# Altium footprint library Pcblib.PcbLib: 281 footprints (part 17 of 18)
Each footprint in its own frame and in the unit in brackets; x right, y up, seen from the top. Pads: shape width x height; smd on the part's side, far side on the other; paste and mask are expansions set on the pad; w line width, h text height; cw(c..) or ccw(c..) is an arc to the next point about the centre after c.
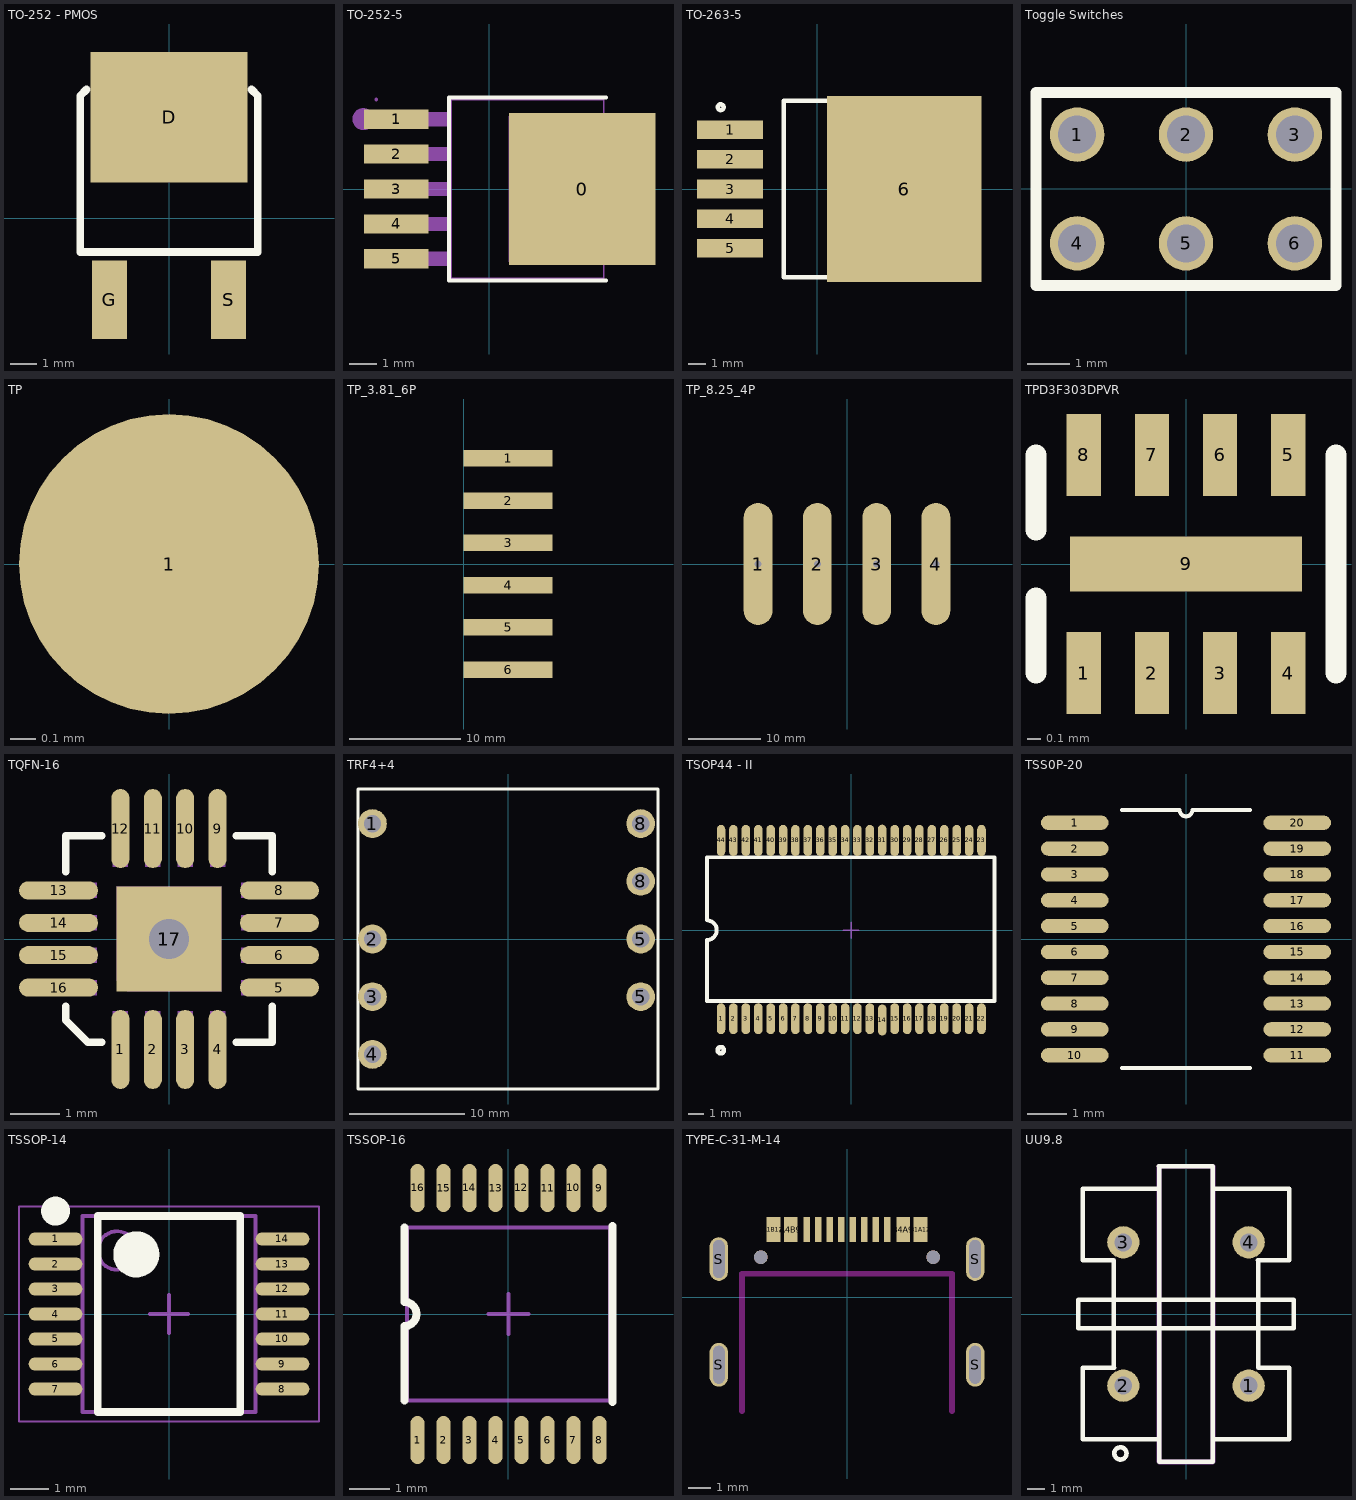
[diagram p16: the footprints below, top view; thin cyan lines are the x and y axes]

## TO-252 - PMOS [mm] "output current 500mA /FPM"
height 2.3
pads (3):
  rect 6x5 smd: D(0,3.875)
  rect 1.35x3 smd: G(-2.285,-3.125) S(2.285,-3.125)
Top Overlay:
  lines w0.3: -3.162,4.937 -3.4,4.699 -3.4,-1.296 3.4,-1.296 3.4,4.699 3.162,4.937
3D body: height 1.35, standoff 0, extent -3.443,-0.204 3.415,5.13

## TO-252-5 [mm]
pads (6):
  rect 5.324x5.512 smd paste+0 mask+0.051: 0(3.379,0)
  rect 2.357x0.7 smd paste+0 mask+0.051: 1(-3.379,2.54) 2(-3.379,1.27) 3(-3.379,0) 4(-3.379,-1.27) 5(-3.379,-2.54)
Top Overlay:
  lines w0.152: 4.243,-3.326 -1.46,-3.326 -1.46,3.326 4.243,3.326
Mechanical 6:
  circle w0.4: c-4.572,2.54 r0.2
Mechanical 15:
  region: 0.717,-2.65 0.717,2.65 5.062,2.65 5.592,2.12 5.592,-2.12 5.062,-2.65
  region: -2.528,-2.79 -2.528,-2.29 -1.373,-2.29 -1.373,-2.79
  region: -4.108,-2.79 -4.108,-2.29 -2.518,-2.29 -2.518,-2.79
  region: -2.528,-1.52 -2.528,-1.02 -1.373,-1.02 -1.373,-1.52
  region: -4.108,-1.52 -4.108,-1.02 -2.518,-1.02 -2.518,-1.52
  region: -2.528,-0.25 -2.528,0.25 -1.373,0.25 -1.373,-0.25
  region: -4.108,-0.25 -4.108,0.25 -2.518,0.25 -2.518,-0.25
  region: -2.528,1.02 -2.528,1.52 -1.373,1.52 -1.373,1.02
  region: -4.108,1.02 -4.108,1.52 -2.518,1.52 -2.518,1.02
  region: -2.528,2.29 -2.528,2.79 -1.373,2.79 -1.373,2.29
  region: -4.108,2.29 -4.108,2.79 -2.518,2.79 -2.518,2.29
  region: -4.048,3.25 -4.048,3.275 -4.083,3.31 -4.133,3.31 -4.168,3.275 -4.168,3.25 -4.168,3.225 -4.133,3.19 -4.083,3.19 -4.048,3.225
  lines w0.051: -1.383,-3.25 4.167,-3.25 4.167,3.25 -1.383,3.25 -1.383,-3.25

## TO-263-5 [mm]
pads (6):
  rect 3.8x1.069 smd: 1(-5.003,3.404) 2(-5.003,1.702) 3(-5.003,0) 4(-5.003,-1.702) 5(-5.003,-3.404)
  rect 8.89x10.66 smd: 6(5.002,0)
Top Overlay:
  circle w0.254: c-5.539,4.699 r0.165
  lines w0.254: 1.143,-5.08 -1.918,-5.08 -1.918,5.08 1.143,5.08

## Toggle Switches [mil]
pads (6):
  round 50 hole 35: 1(-100,50) 2(0,50) 3(100,50) 4(-100,-50) 5(0,-50) 6(100,-50)
Top Overlay:
  lines w10: -137.8,-88.58 137.8,-88.58 137.8,88.58 -137.8,88.58 -137.8,-88.58

## TP [mm]
pads (1):
  round 1.2 smd paste-1: 1(0,0)

## TP_3.81_6P [mm]
pads (6):
  rect 8x1.5 smd paste-1: 1(4,9.525) 2(4,5.715) 3(4,1.905) 4(4,-1.905) 5(4,-5.715) 6(4,-9.525)

## TP_8.25_4P [mm]
pads (4):
  oval 4x17 hole 1: 1(-12.375,0) 2(-4.125,0) 3(4.125,0) 4(12.375,0)

## TPD3F303DPVR [mm]
pads (9):
  rect 0.25x0.6 smd mask+0.05: 1(-0.75,-0.8) 2(-0.25,-0.8) 3(0.25,-0.8) 4(0.75,-0.8) 5(0.75,0.8) 6(0.25,0.8) 7(-0.25,0.8) 8(-0.75,0.8)
  rect 1.7x0.4 smd mask+0.05: 9(0,0)
Top Overlay:
  lines w0.152: -1.1,-0.8 -1.1,-0.25 ; -1.1,0.25 -1.1,0.8 ; 1.1,-0.8 1.1,0.8
3D body "DPV8_1P7X0P4.step": height 0.65, standoff 0, extent -1.05,-0.8 1.05,0.8

## TQFN-16 [mm]
pads (18):
  oval 0.364x1.587 smd: 1(-0.975,-2.218) 2(-0.325,-2.218) 3(0.325,-2.218) 4(0.975,-2.218) 9(0.975,2.218) 10(0.325,2.218) 11(-0.325,2.218) 12(-0.975,2.218)
  oval 1.587x0.364 smd: 5(2.218,-0.975) 6(2.218,-0.325) 7(2.218,0.325) 8(2.218,0.975) 13(-2.218,0.975) 14(-2.218,0.325) 15(-2.218,-0.325) 16(-2.218,-0.975)
  rect 2.1x2.1 smd: 17(0,0)
  round 1.016 hole 0.813: 17(0,0)
Top Overlay:
  lines w0.152: -2.076,-1.347 -2.076,-1.634 -1.634,-2.076 -1.347,-2.076 ; -2.076,1.347 -2.076,2.076 -1.347,2.076 ; 1.347,-2.076 2.076,-2.076 2.076,-1.347 ; 1.347,2.076 2.076,2.076 2.076,1.347
Mechanical 5:
  region: -1.05,-0.84 -1.05,1.05 1.05,1.05 1.05,-1.05 -0.84,-1.05
  region: -1.45,-1.125 -1.45,-0.825 -2,-0.825 -2,-1.125
  region: -1.45,-0.475 -1.45,-0.175 -2,-0.175 -2,-0.475
  region: -1.45,0.175 -1.45,0.475 -2,0.475 -2,0.175
  region: -1.45,0.825 -1.45,1.125 -2,1.125 -2,0.825
  region: -1.125,2 -1.125,1.45 -0.825,1.45 -0.825,2
  region: -0.475,2 -0.475,1.45 -0.175,1.45 -0.175,2
  region: 0.175,2 0.175,1.45 0.475,1.45 0.475,2
  region: 0.825,2 0.825,1.45 1.125,1.45 1.125,2
  region: 1.45,0.825 1.45,1.125 2,1.125 2,0.825
  region: 1.45,0.175 1.45,0.475 2,0.475 2,0.175
  region: 1.45,-0.475 1.45,-0.175 2,-0.175 2,-0.475
  region: 1.45,-1.125 1.45,-0.825 2,-0.825 2,-1.125
  region: 0.825,-2 0.825,-1.45 1.125,-1.45 1.125,-2
  region: 0.175,-2 0.175,-1.45 0.475,-1.45 0.475,-2
  region: -0.475,-2 -0.475,-1.45 -0.175,-1.45 -0.175,-2
  region: -1.125,-2 -1.125,-1.45 -0.825,-1.45 -0.825,-2
Mechanical 15:
  circle w0.15: c-0.975,-2.3 r0.075

## TRF4+4 [mm]
pads (8):
  round 2.5 hole 1.5: 1(-11.75,10) 2(-11.75,0) 3(-11.75,-5) 4(-11.75,-10) 5(11.5,-5) 5(11.5,0) 8(11.5,5) 8(11.5,10)
Top Overlay:
  lines w0.254: -13,-13 13,-13 13,13 -13,13 -13,-13

## TSOP44 - II [mm]
pads (44):
  oval 0.55x2 smd: 1(-8.4,-5.715) 2(-7.6,-5.715) 3(-6.8,-5.715) 4(-6,-5.715) 5(-5.2,-5.715) 6(-4.4,-5.715) 7(-3.6,-5.715) 8(-2.8,-5.715) 9(-2,-5.715) 10(-1.2,-5.715) 11(-0.4,-5.715) 12(0.4,-5.715) 13(1.2,-5.715) 14(2,-5.8) 15(2.8,-5.715) 16(3.6,-5.715) 17(4.4,-5.715) 18(5.2,-5.715) 19(6,-5.715) 20(6.8,-5.715) 21(7.6,-5.715) 22(8.4,-5.715) 23(8.4,5.785) 24(7.6,5.785) 25(6.8,5.785) 26(6,5.785) 27(5.2,5.785) 28(4.4,5.785) 29(3.6,5.785) 30(2.8,5.785) 31(1.986,5.8) 32(1.2,5.785) 33(0.4,5.785) 34(-0.4,5.785) 35(-1.2,5.785) 36(-2,5.785) 37(-2.8,5.785) 38(-3.6,5.785) 39(-4.4,5.785) 40(-5.2,5.785) 41(-6,5.785) 42(-6.8,5.785) 43(-7.6,5.785) 44(-8.4,5.785)
Top Overlay:
  circle w0.3: c-8.414,-7.745 r0.2
  lines w0.254: -9.314,-0.635 ccw(c-9.314,0) -9.314,0.635 ; -9.303,-0.72 -9.303,-4.572 9.239,-4.572 9.239,4.699 -9.303,4.699 -9.303,0.65
Mechanical 15:
  lines w0.1: -0.508,0 0.492,0 ; 0,-0.508 0,0.492
3D body: height 1.35, standoff 0, extent -9.176,-5.08 9.286,5.08

## TSS0P-20 [mm] "TSSOP20"
height 2.65
pads (20):
  oval 1.7x0.36 smd: 1(-2.8,2.925) 2(-2.8,2.275) 3(-2.8,1.625) 4(-2.8,0.975) 5(-2.8,0.325) 6(-2.8,-0.325) 7(-2.8,-0.975) 8(-2.8,-1.625) 9(-2.8,-2.275) 10(-2.8,-2.925) 11(2.8,-2.925) 12(2.8,-2.275) 13(2.8,-1.625) 14(2.8,-0.975) 15(2.8,-0.325) 16(2.8,0.325) 17(2.8,0.975) 18(2.8,1.625) 19(2.8,2.275) 20(2.8,2.925)
Top Overlay:
  lines w0.1: -1.615,-3.25 1.615,-3.25 ; -1.615,3.25 -0.162,3.25 ccw(c0,3.25) 0.162,3.25 1.615,3.25

## TSSOP-14 [mm] "TSOP, 14-Leads, Body 4.96x4.40mm, Pitch 0.65mm, IPC Medium Density"
height 1.2
pads (14):
  oval 1.4x0.35 smd: 1(-2.95,1.95) 2(-2.95,1.3) 3(-2.95,0.65) 4(-2.95,0) 5(-2.95,-0.65) 6(-2.95,-1.3) 7(-2.95,-1.95) 8(2.95,-1.95) 9(2.95,-1.3) 10(2.95,-0.65) 11(2.95,0) 12(2.95,0.65) 13(2.95,1.3) 14(2.95,1.95)
Top Overlay:
  circle w0.5: c-2.95,2.675 r0.125
  circle w0.6: c-0.85,1.55 r0.3
  lines w0.2: -1.85,-2.55 -1.85,2.55 1.85,2.55 1.85,-2.55 -1.85,-2.55
Mechanical 13:
  circle w0.1: c-1.35,1.65 r0.5
  lines w0.1: -2.25,-2.55 -2.25,2.55 2.25,2.55 2.25,-2.55 -2.25,-2.55
Mechanical 15:
  lines w0.05: -3.9,-2.8 -3.9,2.8 3.9,2.8 3.9,-2.8 -3.9,-2.8
  lines w0.1: -0.5,0 0.5,0 ; 0,-0.5 0,0.5
3D body: height 1.2, standoff 0.1, extent -2.25,-2.55 2.25,2.55

## TSSOP-16 [mm]
height 1.2
pads (16):
  oval 0.35x1.2 smd: 1(-2.275,-3.15) 2(-1.625,-3.15) 3(-0.975,-3.15) 4(-0.325,-3.15) 5(0.325,-3.15) 6(0.975,-3.15) 7(1.625,-3.15) 8(2.275,-3.15) 9(2.275,3.15) 10(1.625,3.15) 11(0.975,3.15) 12(0.325,3.15) 13(-0.325,3.15) 14(-0.975,3.15) 15(-1.625,3.15) 16(-2.275,3.15)
Top Overlay:
  lines w0.2: -2.6,-2.159 -2.6,-0.3 ccw(c-2.6,0) -2.6,0.3 -2.6,2.159 ; 2.6,-2.2 2.6,2.2
Mechanical 13:
  lines w0.1: -2.54,-2.159 2.54,-2.159 2.54,2.159 -2.54,2.159 -2.54,-2.159
Mechanical 15:
  lines w0.1: -0.5,0 0.5,0 ; 0,-0.5 0,0.5
3D body: height 1.35, standoff 0, extent -2.54,-2.159 2.54,2.159

## TYPE-C-31-M-14 [mm]
pads (18):
  rect 0.6x1.1 smd: A1B12(-3.2,2.94) A4B9(-2.45,2.94) B1A12(3.2,2.94) B4A9(2.45,2.94)
  rect 0.3x1.1 smd: A5(-1.249,2.94) A6(-0.251,2.94) A7(0.25,2.94) A8(1.25,2.94) B5(1.75,2.94) B6(0.75,2.94) B7(-0.751,2.94) B8(-1.749,2.94)
  oval 0.8x1.9 hole 0.5 slot 1.65 at 90 deg: S(-5.575,-2.94) S(-5.575,1.66) S(5.575,-2.94) S(5.575,1.66)
  round 0.6 hole 0.6 unplated: ""(-3.75,1.74) ""(3.75,1.74)
Keep-Out Layer:
  lines w0.254: -4.572,-4.953 -4.572,1.016 4.445,1.016 4.572,1.016 4.572,-4.953
3D body "User Library-TYPE-C-31-M-14.STEP": height 1.92, standoff -1.24, extent -5.762,-5.156 5.711,3.424

## UU9.8 [mm]
pads (4):
  round 1.8 hole 1: 1(3.5,-4) 2(-3.5,-4) 3(-3.5,4) 4(3.5,4)
Top Overlay:
  circle w0.254: c-3.66,-7.78 r0.341
  lines w0.254: -1.51,8.25 1.5,8.25 1.5,7 ; -1.5,8.25 -1.5,7 ; -1.5,-7 -1.5,7 ; -1.5,-7 -5.75,-7 -5.75,-3 -5.741,-2.991 -4.009,-2.991 -4.025,-2.975 -4.025,3 -5.75,3 -5.75,7 -1.5,7 ; -1.5,-7 -1.5,-8.25 1.5,-8.25 1.5,-7 ; 1.5,-7 1.5,7 ; 1.5,-7 5.75,-7 5.75,-3 4.025,-3 4.025,2.975 4.009,2.991 5.741,2.991 5.75,3 5.75,7 1.5,7 ; -6,-0.8 6,-0.8 6,0.8 -6,0.8 -6,-0.8
Mechanical 15:
  region: -1.62,8.31 -1.62,-8.28 -1.53,-8.37 1.53,-8.37 1.62,-8.28 1.62,8.28 1.53,8.37 -1.23,8.37 -1.23,8.13 1.37,8.13 1.38,8.12 1.38,-8.12 1.37,-8.13 -1.37,-8.13 -1.38,-8.12 -1.38,8.13 -1.24,8.13 -1.24,8.37 -1.53,8.37